# Altium footprint library KNR_Kurs.PcbLib: 250 footprints (part 4 of 16)
Each footprint in its own frame and in the unit in brackets; x right, y up, seen from the top. Pads: shape width x height; smd on the part's side, far side on the other; paste and mask are expansions set on the pad; w line width, h text height; cw(c..) or ccw(c..) is an arc to the next point about the centre after c.
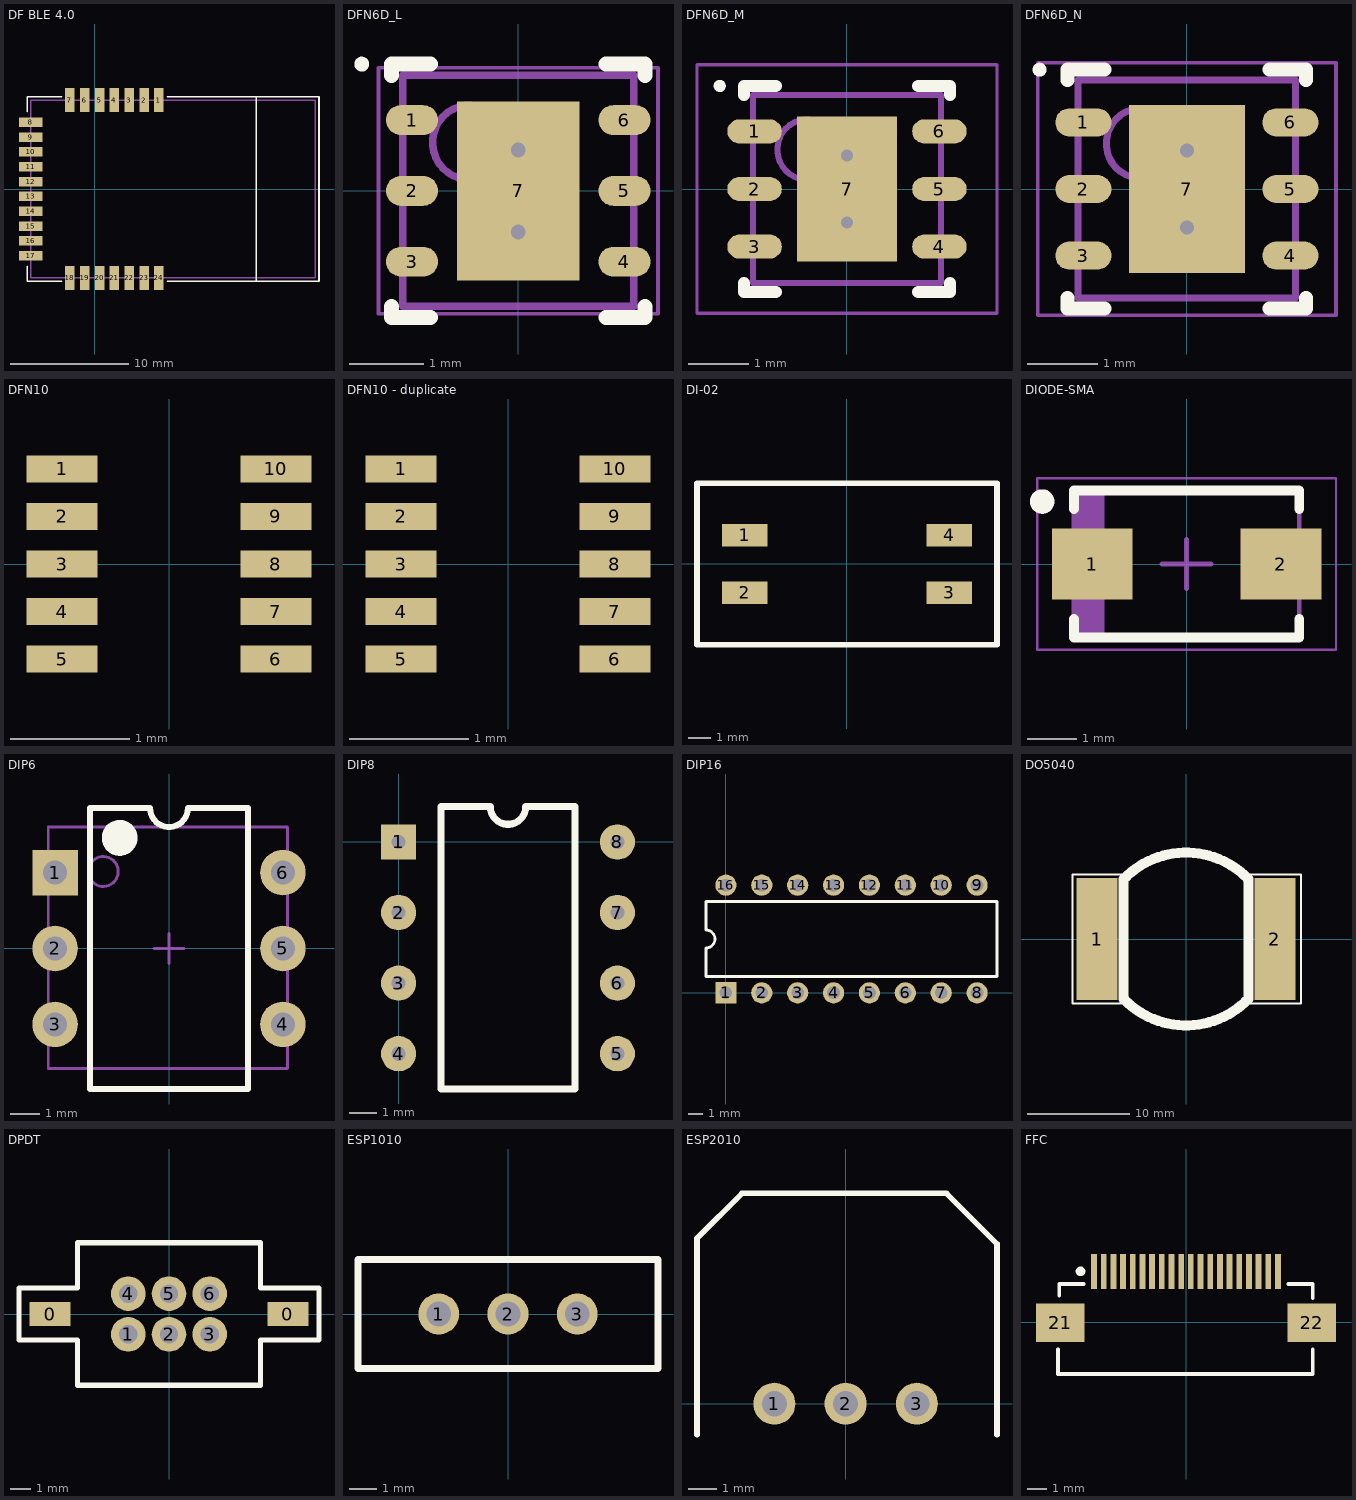
[diagram p3: the footprints below, top view; thin cyan lines are the x and y axes]

## DF BLE 4.0 [mm]
pads (24):
  rect 0.8x2 smd: 1(5.4,7.5) 2(4.15,7.5) 3(2.9,7.5) 4(1.65,7.5) 5(0.4,7.5) 6(-0.85,7.5) 7(-2.1,7.5) 18(-2.1,-7.5) 19(-0.85,-7.5) 20(0.4,-7.5) 21(1.65,-7.5) 22(2.9,-7.5) 23(4.15,-7.5) 24(5.4,-7.5)
  rect 2x0.8 smd: 8(-5.4,5.625) 9(-5.4,4.375) 10(-5.4,3.125) 11(-5.4,1.875) 12(-5.4,0.625) 13(-5.4,-0.625) 14(-5.4,-1.875) 15(-5.4,-3.125) 16(-5.4,-4.375) 17(-5.4,-5.625)
Top Overlay:
  lines w0.127: -5.7,-6.5 -5.7,-7.8 -2.8,-7.8 ; -5.7,6.5 -5.7,7.8 -2.8,7.8 ; 6.1,-7.8 18.9,-7.8 18.9,4.9 18.9,7.8 6.1,7.8 ; 13.6,-7.8 13.6,7.8
Mechanical 1:
  lines w0.127: -5.4,-7.5 -5.4,7.5 18.6,7.5 18.6,-7.5 -5.4,-7.5
3D body: height 1.5, standoff 0, extent -5.4,-7.5 18.6,7.5

## DFN6D_L [mm] "SON, 6-Leads, Body 3x3mm, Pitch 0.95mm, Thermal Pad 2.4x1.65mm, IPC High Density"
height 0.95
pads (7):
  oval 0.7x0.4 smd: 1(-1.425,0.95) 2(-1.425,0) 3(-1.425,-0.95) 4(1.425,-0.95) 5(1.425,0) 6(1.425,0.95)
  rect 1.65x2.4 smd: 7(0,0)
via 0,0.55 diameter 0.5 hole 0.2
via 0,-0.55 diameter 0.5 hole 0.2
Top Overlay:
  circle w0.1: c-2.1,1.7 r0.05
  lines w0.2: -1.7,-1.55 -1.7,-1.7 -1.175,-1.7 ; -1.7,1.55 -1.7,1.7 -1.175,1.7 ; 1.175,-1.7 1.7,-1.7 1.7,-1.55 ; 1.175,1.7 1.7,1.7 1.7,1.55
Mechanical 13:
  circle w0.1: c-0.65,0.65 r0.5
  lines w0.1: -1.55,-1.55 -1.55,1.55 1.55,1.55 1.55,-1.55 -1.55,-1.55
Mechanical 15:
  lines w0.05: -1.875,-1.65 -1.875,1.65 1.875,1.65 1.875,-1.65 -1.875,-1.65
  lines w0.1: -0.5,0 0.5,0 ; 0,-0.5 0,0.5
3D body "User Library-dfn6_3x3_rm0_95.step": height 0.75, standoff -0.05, extent -1.55,-1.5 1.55,1.5

## DFN6D_M [mm] "SON, 6-Leads, Body 3x3mm, Pitch 0.95mm, Thermal Pad 2.4x1.65mm, IPC Low Density"
height 0.95
pads (7):
  oval 0.9x0.4 smd: 1(-1.525,0.95) 2(-1.525,0) 3(-1.525,-0.95) 4(1.525,-0.95) 5(1.525,0) 6(1.525,0.95)
  rect 1.65x2.4 smd: 7(0,0)
via 0,-0.55 diameter 0.5 hole 0.2
via 0,0.55 diameter 0.5 hole 0.2
Top Overlay:
  circle w0.1: c-2.1,1.7 r0.05
  lines w0.2: -1.7,-1.55 -1.7,-1.7 -1.175,-1.7 ; -1.7,1.55 -1.7,1.7 -1.175,1.7 ; 1.175,-1.7 1.7,-1.7 1.7,-1.55 ; 1.175,1.7 1.7,1.7 1.7,1.55
Mechanical 13:
  circle w0.1: c-0.65,0.65 r0.5
  lines w0.1: -1.55,-1.55 1.55,-1.55 1.55,1.55 -1.55,1.55 -1.55,-1.55
Mechanical 15:
  lines w0.05: -2.475,-2.05 2.475,-2.05 2.475,2.05 -2.475,2.05 -2.475,-2.05
  lines w0.1: -0.5,0 0.5,0 ; 0,-0.5 0,0.5
3D body "User Library-dfn6_3x3_rm0_95.step": height 0.79, standoff -0.01, extent -1.55,-1.5 1.55,1.5

## DFN6D_N [mm] "SON, 6-Leads, Body 3x3mm, Pitch 0.95mm, Thermal Pad 2.4x1.65mm, IPC Medium Density"
height 0.95
pads (7):
  oval 0.8x0.4 smd: 1(-1.475,0.95) 2(-1.475,0) 3(-1.475,-0.95) 4(1.475,-0.95) 5(1.475,0) 6(1.475,0.95)
  rect 1.65x2.4 smd: 7(0,0)
via 0,0.55 diameter 0.5 hole 0.2
via 0,-0.55 diameter 0.5 hole 0.2
Top Overlay:
  circle w0.1: c-2.1,1.7 r0.05
  lines w0.2: -1.7,-1.55 -1.7,-1.7 -1.175,-1.7 ; -1.7,1.55 -1.7,1.7 -1.175,1.7 ; 1.175,-1.7 1.7,-1.7 1.7,-1.55 ; 1.175,1.7 1.7,1.7 1.7,1.55
Mechanical 13:
  circle w0.1: c-0.65,0.65 r0.5
  lines w0.1: -1.55,-1.55 -1.55,1.55 1.55,1.55 1.55,-1.55 -1.55,-1.55
Mechanical 15:
  lines w0.05: -2.125,-1.8 -2.125,1.8 2.125,1.8 2.125,-1.8 -2.125,-1.8
  lines w0.1: -0.5,0 0.5,0 ; 0,-0.5 0,0.5
3D body "User Library-dfn6_3x3_rm0_95.step": height 0.75, standoff -0.05, extent -1.55,-1.5 1.55,1.5

## DFN10 [mm] "DFN 10-pin (2 x 2 x 0.85 mm)"
height 0.85
pads (10):
  rect 0.6x0.225 smd mask+0.063: 1(-0.9,0.8) 2(-0.9,0.4) 3(-0.9,0) 4(-0.9,-0.4) 5(-0.9,-0.8) 6(0.9,-0.8) 7(0.9,-0.4) 8(0.9,0) 9(0.9,0.4) 10(0.9,0.8)
Top Solder:
  region: 0.537,0.975 1.262,0.975 1.262,-0.975 0.537,-0.975
  region: -1.262,0.975 -0.537,0.975 -0.537,-0.975 -1.262,-0.975
3D body: height 0.85, standoff 0, extent -1,-1 1,1

## DFN10 - duplicate [mm] "DFN 10-pin (2 x 2 x 0.85 mm)"
height 0.85
pads (10):
  rect 0.6x0.225 smd mask+0.063: 1(-0.9,0.8) 2(-0.9,0.4) 3(-0.9,0) 4(-0.9,-0.4) 5(-0.9,-0.8) 6(0.9,-0.8) 7(0.9,-0.4) 8(0.9,0) 9(0.9,0.4) 10(0.9,0.8)
Top Solder:
  region: 0.537,0.975 1.262,0.975 1.262,-0.975 0.537,-0.975
  region: -1.262,0.975 -0.537,0.975 -0.537,-0.975 -1.262,-0.975
3D body: height 0.85, standoff 0, extent -1,-1 1,1

## DI-02 [mm] "DIP Switch, 2 Position, Package"
pads (4):
  rect 2x1 smd: 1(-4.496,1.27) 2(-4.496,-1.27) 3(4.504,-1.27) 4(4.504,1.27)
Top Overlay:
  lines w0.254: -6.604,-3.556 -6.604,3.556 6.604,3.556 6.604,-3.556 -6.604,-3.556
3D body "DI-02.stp": height 4.6, standoff 0, extent -5.2,-3 5.2,3

## DIODE-SMA [mm] "Molded Diode, 2-Leads, Body 4,27x2,60mm, IPC Medium Density"
height 2.2
pads (2):
  rect 1.65x1.45 smd: 1(-1.925,0) 2(1.925,0)
Top Overlay:
  circle w0.25: c-2.95,1.275 r0.125
  lines w0.2: -2.3,-1.125 -2.3,-1.5 2.3,-1.5 2.3,-1.125 ; -2.3,1.125 -2.3,1.5 2.3,1.5 2.3,1.125
Mechanical 13:
  rectangle: -2.3,-1.475 -1.681,1.475
  lines w0.1: -2.3,-1.475 -2.3,1.475 2.3,1.475 2.3,-1.475 -2.3,-1.475
Mechanical 15:
  lines w0.05: -3.05,-1.75 -3.05,1.75 3.05,1.75 3.05,-1.75 -3.05,-1.75
  lines w0.1: -0.5,0 0.5,0 ; 0,-0.5 0,0.5
3D body "User Library-DIOM5528X26.step": height 2.6, standoff 0.03, extent -2.75,-1.4 2.75,1.4

## DIP6 [mil] "DIP; 6 Leads; Row Spacing 7.62 mm; Pitch 2.54 mm"
height 214.96
pads (6):
  rect 60x60 hole 32 unplated: 1(-150,100)
  round 60 hole 32 unplated: 2(-150,0) 3(-150,-100) 4(150,-100) 5(150,0) 6(150,100)
Top Overlay:
  circle w23.62: c-64.96,145.67 r11.81
  lines w7.87: -104.33,-185.04 104.33,-185.04 104.33,185.04 25,185.04 cw(c0,185.04) -25,185.04 -104.33,185.04 -104.33,-185.04
Mechanical 13:
  circle w3.94: c-86.61,101.38 r19.68
  lines w3.94: -159.02,-158.03 -159.02,160.08 155.94,160.08 155.94,-158.03 -159.02,-158.03
Mechanical 15:
  lines w3.94: -19.68,0 19.68,0 ; 0,-19.68 0,19.68
3D body "DIP6.step": height 177.56, standoff -121.26, extent -159.02,-158.03 155.94,160.08

## DIP8 [mil]
pads (8):
  rect 50x50 hole 20: 1(0,0)
  round 50 hole 20: 2(0,-100) 3(0,-200) 4(0,-300) 5(310,-300) 6(310,-200) 7(310,-100) 8(310,0)
Top Overlay:
  lines w10: 60,-350 250,-350 250,50 180,50 cw(c155,50) 130,50 60,50 60,-350
3D body "DIP8.stp": height 133.86, standoff -119.63, extent 5,-355.24 305,55

## DIP16 [mm]
pads (16):
  rect 1.5x1.5 hole 0.9: 1(0,0)
  round 1.5 hole 0.9: 2(2.54,0) 3(5.08,0) 4(7.62,0) 5(10.16,0) 6(12.7,0) 7(15.24,0) 8(17.78,0) 9(17.78,7.62) 10(15.24,7.62) 11(12.7,7.62) 12(10.16,7.62) 13(7.62,7.62) 14(5.08,7.62) 15(2.54,7.62) 16(0,7.62)
Top Overlay:
  lines w0.2: -1.41,1.16 19.19,1.16 19.19,6.46 -1.41,6.46 -1.41,4.445 cw(c-1.41,3.81) -1.41,3.175 -1.41,1.16
3D body "DIP16.stp": height 4.5, standoff -1.94, extent -1.38,-0.02 19.2,7.6

## DO5040 [mm]
pads (2):
  rect 4x12 smd: 1(-8.75,0) 2(8.75,0)
Top Overlay:
  lines w0.2: -5.969,-6.35 -11.176,-6.35 -11.176,6.35 -5.842,6.35 ; 5.588,-6.35 11.303,-6.35 11.303,6.35 6.096,6.35
  lines w1: -6.137,-5.874 ccw(c-6.119,-5.874) -6.132,-5.887 ccw(c0,0) 6.137,-5.881 cw(c6.149,-5.869) 6.132,-5.869 6.132,5.887 ccw(c0,0) -6.137,5.881 -6.137,-5.874
3D body "DO5040.stp": height 11.1, standoff 0, extent -9.906,-8.001 10.167,7.999

## DPDT [mm] "Double pole, double throw"
pads (8):
  rect 2x1.2 smd: 0(-5.842,0) 0(5.842,0)
  round 1.7 hole 0.9: 1(-2,-1) 2(0,-1) 3(2,-1) 4(-2,1) 5(0,1) 6(2,1)
Top Overlay:
  lines w0.254: -7.366,-1.27 -4.5,-1.27 -4.5,-3.5 4.5,-3.5 4.5,-1.27 7.366,-1.27 7.366,1.27 4.5,1.27 4.5,3.5 -4.5,3.5 -4.5,1.27 -7.366,1.27 -7.366,-1.27
3D body "DPDT.stp": height 1.5, standoff -8.7, extent -6.775,-3.371 6.825,3.429

## ESP1010 [mm] "ON - ON Switch tht vertical"
pads (3):
  round 1.5 hole 0.9: 1(-2.54,0) 2(0,0) 3(2.54,0)
Top Overlay:
  lines w0.254: -5.5,-2 -5.5,2 5.5,2 5.5,-2 -5.5,-2
3D body "Switch_SPDT_V.stp": height 6.8, standoff -1.5, extent -5,-1.255 5,1.245

## ESP2010 [mm] "ON - ON Switch tht"
pads (3):
  round 1.5 hole 0.9: 1(-2.54,0) 2(0,0) 3(2.54,0)
Top Overlay:
  lines w0.2: -5.3,-1.1 -5.3,5.9 -3.7,7.5 3.6,7.5 5.4,5.7 5.4,-1.1
3D body "Switch_SPDT.stp": height 2.5, standoff -1.5, extent -5,-0.401 5,7.3

## FFC [mm]
height 3
pads (22):
  rect 0.3x1.8 smd: 1(-4.75,2.625) 2(-4.25,2.625) 3(-3.75,2.625) 4(-3.25,2.625) 5(-2.75,2.625) 6(-2.25,2.625) 7(-1.75,2.625) 8(-1.25,2.625) 9(-0.75,2.625) 10(-0.25,2.625) 11(0.25,2.625) 12(0.75,2.625) 13(1.25,2.625) 14(1.75,2.625) 15(2.25,2.625) 16(2.75,2.625) 17(3.25,2.625) 18(3.75,2.625) 19(4.25,2.625) 20(4.75,2.625)
  rect 2.5x2 smd: 21(-6.5,-0.025) 22(6.5,-0.025)
Top Overlay:
  circle w0.25: c-5.45,2.625 r0.125
  lines w0.2: -6.604,-1.413 -6.604,-2.683 6.55,-2.683 6.55,-1.413 ; -6.55,1.381 -6.55,1.977 -5.3,1.977 ; 5.3,1.977 6.55,1.977 6.55,1.254